# Altium footprint library wilamp_st_v1p00.PcbLib: 52 footprints (part 1 of 4)
Each footprint in its own frame and in the unit in brackets; x right, y up, seen from the top. Pads: shape width x height; smd on the part's side, far side on the other; paste and mask are expansions set on the pad; w line width, h text height; cw(c..) or ccw(c..) is an arc to the next point about the centre after c.
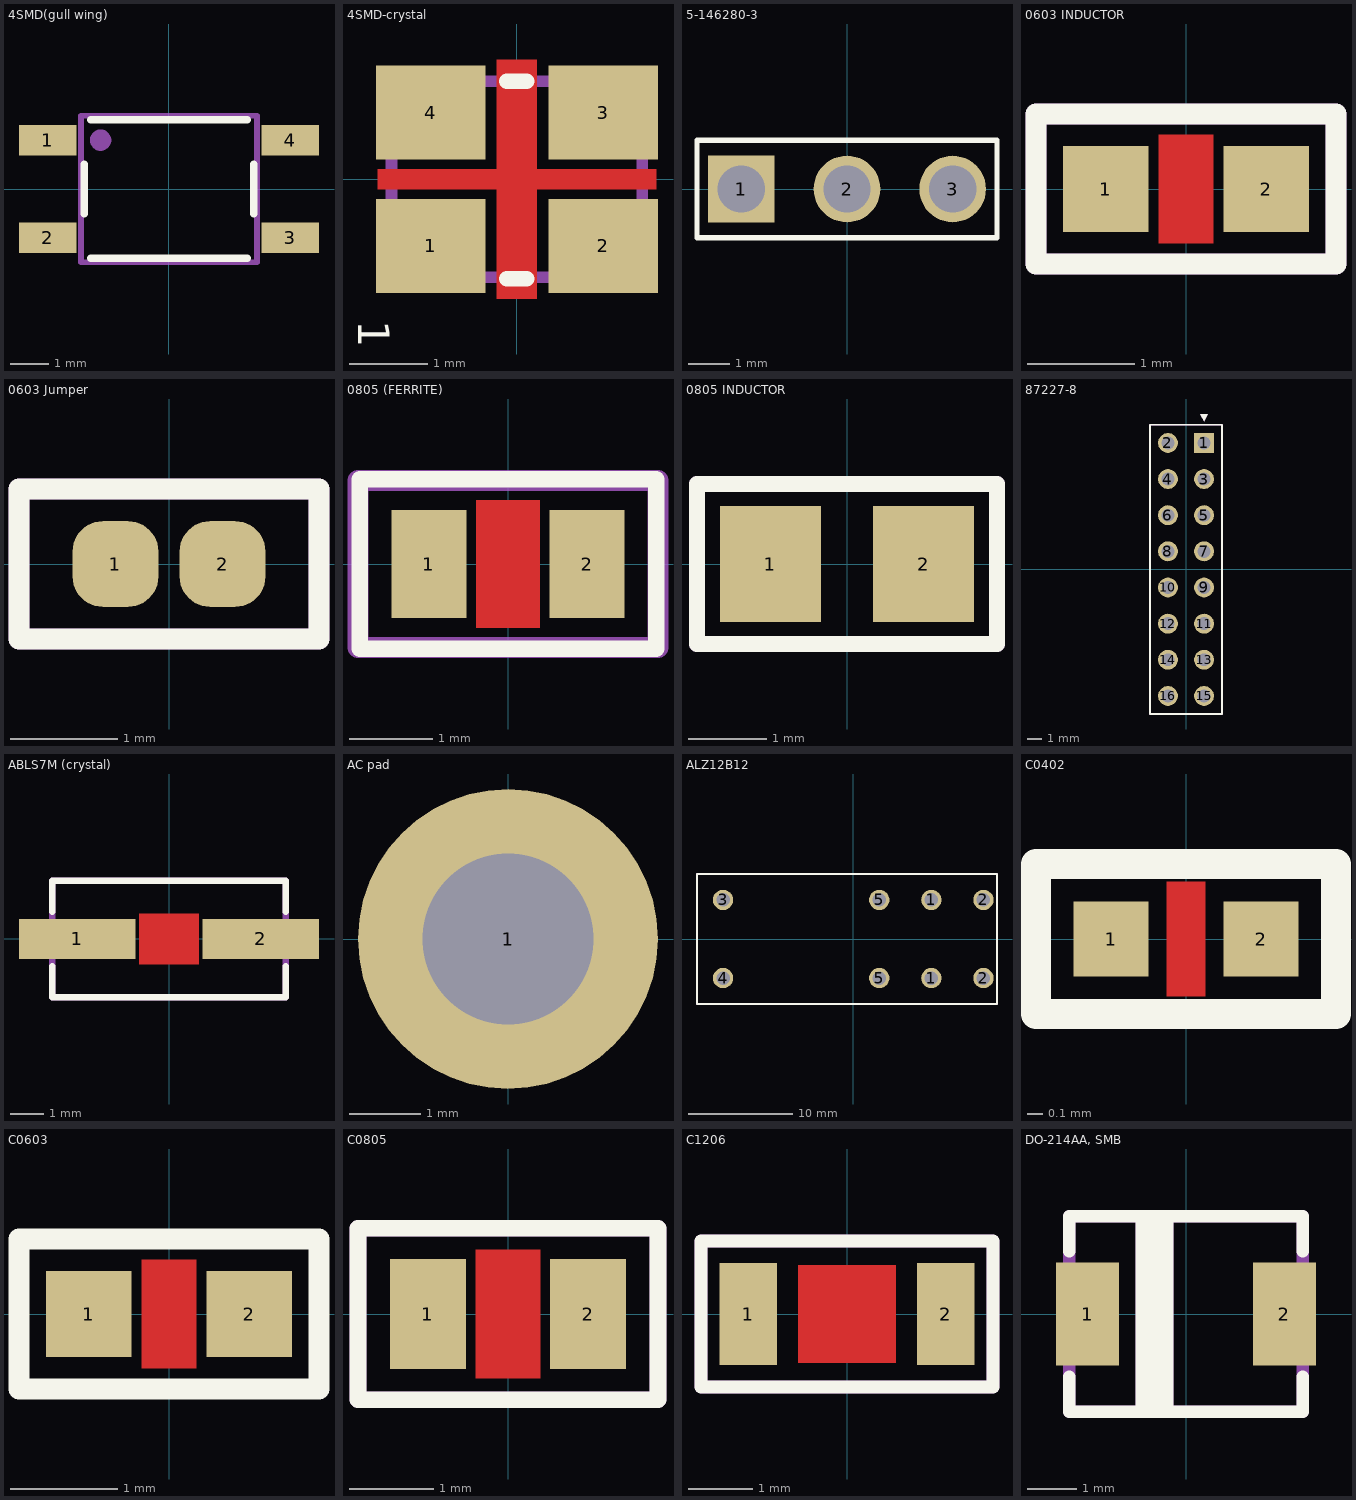
[diagram p0: the footprints below, top view; thin cyan lines are the x and y axes]

## 4SMD(gull wing) [mm]
pads (4):
  rect 1.5x0.8 smd: 1(-3.15,1.27) 2(-3.15,-1.27) 3(3.15,-1.27) 4(3.15,1.27)
Top Overlay:
  lines w0.2: -2.2,-0.635 -2.2,0.635 ; -2.032,-1.8 2.032,-1.8 ; -2.032,1.8 2.032,1.8 ; 2.2,-0.635 2.2,0.635
Mechanical 16:
  circle w0.3: c-1.778,1.27 r0.127
  lines w0.15: -2.286,-1.905 -2.286,1.905 ; -2.286,-1.905 2.286,-1.905 ; -2.286,-1.905 -2.286,1.905 ; -2.286,-1.905 2.286,-1.905 ; -2.286,1.905 2.286,1.905 ; -2.286,1.905 2.286,1.905 ; 2.286,-1.905 2.286,1.905 ; 2.286,-1.905 2.286,1.905
Mechanical 29:
  text ".Designator" at -0.5,-0.302 h0.6
3D body "User Library-HCPL-181-1.STEP": height 2, standoff -0.1, extent -3.5,-1.8 3.5,1.8

## 4SMD-crystal [mm]
pads (4):
  rect 1.4x1.2 smd: 1(-1.1,-0.85) 2(1.1,-0.85) 3(1.1,0.85) 4(-1.1,0.85)
Top Layer:
  pour cut-out: -1.778,0.127 -1.778,-0.127 1.778,-0.127 1.778,0.127
  pour cut-out: -0.254,1.524 0.254,1.524 0.254,-1.524 -0.254,-1.524
Top Overlay:
  lines w0.2: -0.127,-1.27 0.127,-1.27 ; -0.127,1.25 0.127,1.25
  text "1" at -2.027,-1.8 h0.4
Mechanical 16:
  circle w0.3: c-1.143,-0.762 r0.127
  lines w0.15: -1.6,-1.25 -1.6,1.25 ; -1.6,-1.25 1.6,-1.25 ; -1.6,-1.25 -1.6,1.25 ; -1.6,-1.25 1.6,-1.25 ; -1.6,1.25 1.6,1.25 ; -1.6,1.25 1.6,1.25 ; 1.6,-1.25 1.6,1.25 ; 1.6,-1.25 1.6,1.25
Mechanical 29:
  text ".Designator" at 0.597,0.321 h0.6
3D body "User Library-Crystal TXC Corp 7M series.step": height 0.8, standoff 0, extent -1.65,-1.3 1.65,1.3

## 5-146280-3 [mm]
pads (3):
  rect 1.6x1.6 hole 1.14: 1(-2.54,0)
  round 1.6 hole 1.14: 2(0,0) 3(2.54,0)
Top Overlay:
  lines w0.127: -3.605,-1.17 -3.605,1.17 3.605,1.17 3.605,-1.17 -3.605,-1.17
Mechanical 29:
  text ".Designator" at -0.879,-0.533 h1
3D body "c-5-146280-3-d-3d.stp": height 8.14, standoff -3.03, extent -3.607,-1.168 3.607,1.168

## 0603 INDUCTOR [mm]
pads (2):
  rect 0.8x0.8 smd: 1(-0.75,0) 2(0.75,0)
Top Layer:
  pour cut-out: -0.254,0.508 0.254,0.508 0.254,-0.508 -0.254,-0.508
Top Overlay:
  lines w0.2: -1.4,-0.7 -1.4,0.7 1.4,0.7 1.4,-0.7 -1.4,-0.7
Mechanical 16:
  lines w0.15: -1.4,-0.7 1.4,-0.7 1.4,0.7 -1.4,0.7 -1.4,-0.7
  lines w0.2: -1.4,-0.7 1.4,-0.7 1.4,0.7 -1.4,0.7 -1.4,-0.7
Mechanical 29:
  text ".Designator" at -0.508,-0.265 h0.6
3D body: height 0.6, standoff 0, extent -0.8,-0.4 0.8,0.4

## 0603 Jumper [mm]
pads (2):
  rrect70% 0.8x0.8 smd: 1(-0.5,0) 2(0.5,0)
Top Overlay:
  lines w0.2: -1.4,-0.7 1.4,-0.7 1.4,0.7 -1.4,0.7 -1.4,-0.7
Mechanical 16:
  lines w0.15: 1.4,-0.7 1.4,0.7
  lines w0.2: -1.4,-0.7 -1.4,0.7 1.4,0.7 1.4,-0.7 -1.4,-0.7
Mechanical 29:
  text ".Designator" at -0.762,-0.254 h0.6

## 0805 (FERRITE) [mm]
pads (2):
  rect 0.9x1.3 smd: 1(-0.95,0) 2(0.95,0)
Top Layer:
  pour cut-out: -0.381,0.762 0.381,0.762 0.381,-0.762 -0.381,-0.762
Top Overlay:
  lines w0.2: -1.778,-1.016 -1.778,1.016 1.778,1.016 1.778,-1.016 -1.778,-1.016
Mechanical 16:
  lines w0.2: -1.778,-1.016 1.778,-1.016 1.778,1.016 -1.778,1.016 -1.778,-1.016
  lines w0.254: -1.8,-1 1.8,-1 1.8,1 -1.8,1 -1.8,-1
Mechanical 29:
  text ".Designator" at 0.707,0.205 h0.6
3D body "User Library-ind_0805.step": height 0.6, standoff -0.6, extent -1,-0.508 1,0.442

## 0805 INDUCTOR [mm]
pads (2):
  rect 1.285x1.47 smd: 1(-0.972,0) 2(0.972,0)
Top Overlay:
  lines w0.2: -1.905,-1.016 1.905,-1.016 1.905,1.016 -1.905,1.016 -1.905,-1.016
Mechanical 16:
  lines w0.2: -1.905,-1.016 -1.905,1.016 1.905,1.016 1.905,-1.016 -1.905,-1.016
Mechanical 29:
  text ".Designator" at 1.651,0.453 h1
3D body "User Library-ind_0805.step": height 0.95, standoff 0, extent -1,-0.6 1,0.6

## 87227-8 [mm]
pads (16):
  rect 1.4x1.4 hole 0.9: 1(1.27,8.89)
  round 1.4 hole 0.9: 2(-1.27,8.89) 3(1.27,6.35) 4(-1.27,6.35) 5(1.27,3.81) 6(-1.27,3.81) 7(1.27,1.27) 8(-1.27,1.27) 9(1.27,-1.27) 10(-1.27,-1.27) 11(1.27,-3.81) 12(-1.27,-3.81) 13(1.27,-6.35) 14(-1.27,-6.35) 15(1.27,-8.89) 16(-1.27,-8.89)
Top Overlay:
  region: 1.016,10.922 1.27,10.414 1.524,10.922
  lines w0.127: -2.54,-10.16 2.54,-10.16 2.54,10.16 -2.54,10.16 -2.54,-10.16
Mechanical 16:
  region: 1.016,10.922 1.27,10.414 1.524,10.922
  lines w0.127: -2.54,-10.16 -2.54,10.16 2.54,10.16 2.54,-10.16 -2.54,-10.16
Mechanical 29:
  text ".Designator" at 1.499,-2.25 h3
3D body "c-0087227-08-h-3d.stp": height 10.58, standoff -2.97, extent -2.54,-9.906 2.54,10.004

## ABLS7M (crystal) [mm]
pads (2):
  rect 3.5x1.2 smd: 1(-2.75,0) 2(2.75,0)
Top Layer:
  pour cut-out: -0.889,0.762 0.889,0.762 0.889,-0.762 -0.889,-0.762
Top Overlay:
  lines w0.2: -3.5,-0.818 -3.5,-1.75 3.5,-1.75 3.5,-0.818 ; -3.5,0.818 -3.5,1.75 3.5,1.75 3.5,0.818
Mechanical 16:
  lines w0.2: -3.5,-1.75 -3.5,1.75 3.5,1.75 3.5,-1.75 -3.5,-1.75
Mechanical 29:
  text ".Designator" at 0.818,-1.224 h1.5
3D body: height 2.3, standoff 0, extent -3.5,-1.75 3.5,1.75

## AC pad [mm]
pads (1):
  round 4.2 hole 2.4: 1(0,0)

## ALZ12B12 [mm]
pads (8):
  round 1.95 hole 1.3: 1(7.5,-3.75) 1(7.5,3.75) 2(12.5,-3.75) 2(12.5,3.75) 3(-12.5,3.75) 4(-12.5,-3.75) 5(2.5,-3.75) 5(2.5,3.75)
Top Overlay:
  lines w0.2: -15,-6.25 13.8,-6.25 13.8,6.25 -15,6.25 -15,-6.25
Mechanical 16:
  lines w0.2: -15,-6.25 13.8,-6.25 13.8,6.25 -15,6.25 -15,-6.25
Mechanical 29:
  text ".Designator" at -4.953,-0.635 h3
3D body: height 15.7, standoff 0, extent -15,-6.25 13.8,6.25

## C0402 [mm]
pads (2):
  rect 0.5x0.5 smd: 1(-0.5,0) 2(0.5,0)
Top Layer:
  pour cut-out: -0.127,0.381 0.127,0.381 0.127,-0.381 -0.127,-0.381
Top Overlay:
  lines w0.2: -1,-0.5 -1,0.5 1,0.5 1,-0.5 -1,-0.5
Mechanical 16:
  lines w0.15: -1,-0.5 -1,0.5 ; -1,-0.5 1,-0.5 ; -1,-0.5 -1,0.5 ; -1,-0.5 1,-0.5 ; -1,0.5 1,0.5 ; -1,0.5 1,0.5 ; 1,-0.5 1,0.5 ; 1,-0.5 1,0.5
Mechanical 29:
  text ".Designator" at 0.686,0.178 h0.4
3D body "User Library-0402C.step": height 0.36, standoff 0, extent -0.5,-0.265 0.5,0.265

## C0603 [mm]
pads (2):
  rect 0.8x0.8 smd: 1(-0.75,0) 2(0.75,0)
Top Layer:
  pour cut-out: -0.254,0.508 0.254,0.508 0.254,-0.508 -0.254,-0.508
Top Overlay:
  lines w0.2: -1.4,-0.7 1.4,-0.7 1.4,0.7 -1.4,0.7 -1.4,-0.7
Mechanical 16:
  lines w0.15: -1.4,-0.7 1.4,-0.7 ; -1.4,-0.7 -1.4,0.7 ; -1.4,-0.7 1.4,-0.7 ; -1.4,-0.7 -1.4,0.7 ; -1.4,0.7 1.4,0.7 ; -1.4,0.7 1.4,0.7 ; 1.4,-0.7 1.4,0.7 ; 1.4,-0.7 1.4,0.7
Mechanical 29:
  text ".Designator" at -1.063,-0.347 h0.6
3D body "C0603.step": height 0.79, standoff 0, extent -0.8,-0.425 0.8,0.435
3D body "C0603.step": height 0.95, standoff 0.15, extent -0.8,-0.425 0.8,0.435

## C0805 [mm]
pads (2):
  rect 0.9x1.3 smd: 1(-0.95,0) 2(0.95,0)
Top Layer:
  pour cut-out: 0.381,0.762 -0.381,0.762 -0.381,-0.762 0.381,-0.762
Top Overlay:
  lines w0.2: -1.778,-1.016 1.778,-1.016 1.778,1.016 -1.778,1.016 -1.778,-1.016
Mechanical 16:
  lines w0.2: -1.778,-1.016 1.778,-1.016 1.778,1.016 -1.778,1.016 -1.778,-1.016
Mechanical 29:
  text ".Designator" at -0.762,-0.254 h0.6
3D body "User Library-C0805-1.step": height 0.8, standoff 0, extent -1,-0.6 1,0.6

## C1206 [mm]
pads (2):
  rect 0.9x1.6 smd: 1(-1.55,0) 2(1.55,0)
Top Layer:
  pour cut-out: 0.762,0.762 -0.762,0.762 -0.762,-0.762 0.762,-0.762
Top Overlay:
  lines w0.2: -2.286,-1.143 2.286,-1.143 2.286,1.143 -2.286,1.143 -2.286,-1.143
Mechanical 16:
  lines w0.2: -2.286,-1.143 2.286,-1.143 2.286,1.143 -2.286,1.143 -2.286,-1.143
Mechanical 29:
  text ".Designator" at 1.388,0.49 h1
3D body "CAPC3216X95N EIA 1206.step": height 0.95, standoff 0, extent -1.6,-0.8 1.6,0.8

## DO-214AA, SMB [mil]
pads (2):
  rect 50x82 smd: 1(-78,0) 2(78,0)
Top Overlay:
  rectangle: -40,-77.56 -10,77.56
  lines w10: -92.52,-50 -92.52,-77.56 92.52,-77.56 92.52,-50 ; -92.52,50 -92.52,77.56 92.52,77.56 92.52,50
Mechanical 16:
  rectangle: -40,-77.56 -10,77.56
  lines w10: -92.52,-77.56 92.52,-77.56 92.52,77.56 -92.52,77.56 -92.52,-77.56
Mechanical 29:
  text ".Designator" at 83.5,12.89 h35
3D body "User Library-DO-214AA(SMB).step": height 102.18, standoff -1.82, extent -109.99,-77.75 110.01,77.75